# Altium footprint library ESKDPcbLib.PcbLib: 608 footprints (part 20 of 38)
Each footprint in its own frame and in the unit in brackets; x right, y up, seen from the top. Pads: shape width x height; smd on the part's side, far side on the other; paste and mask are expansions set on the pad; w line width, h text height; cw(c..) or ccw(c..) is an arc to the next point about the centre after c.
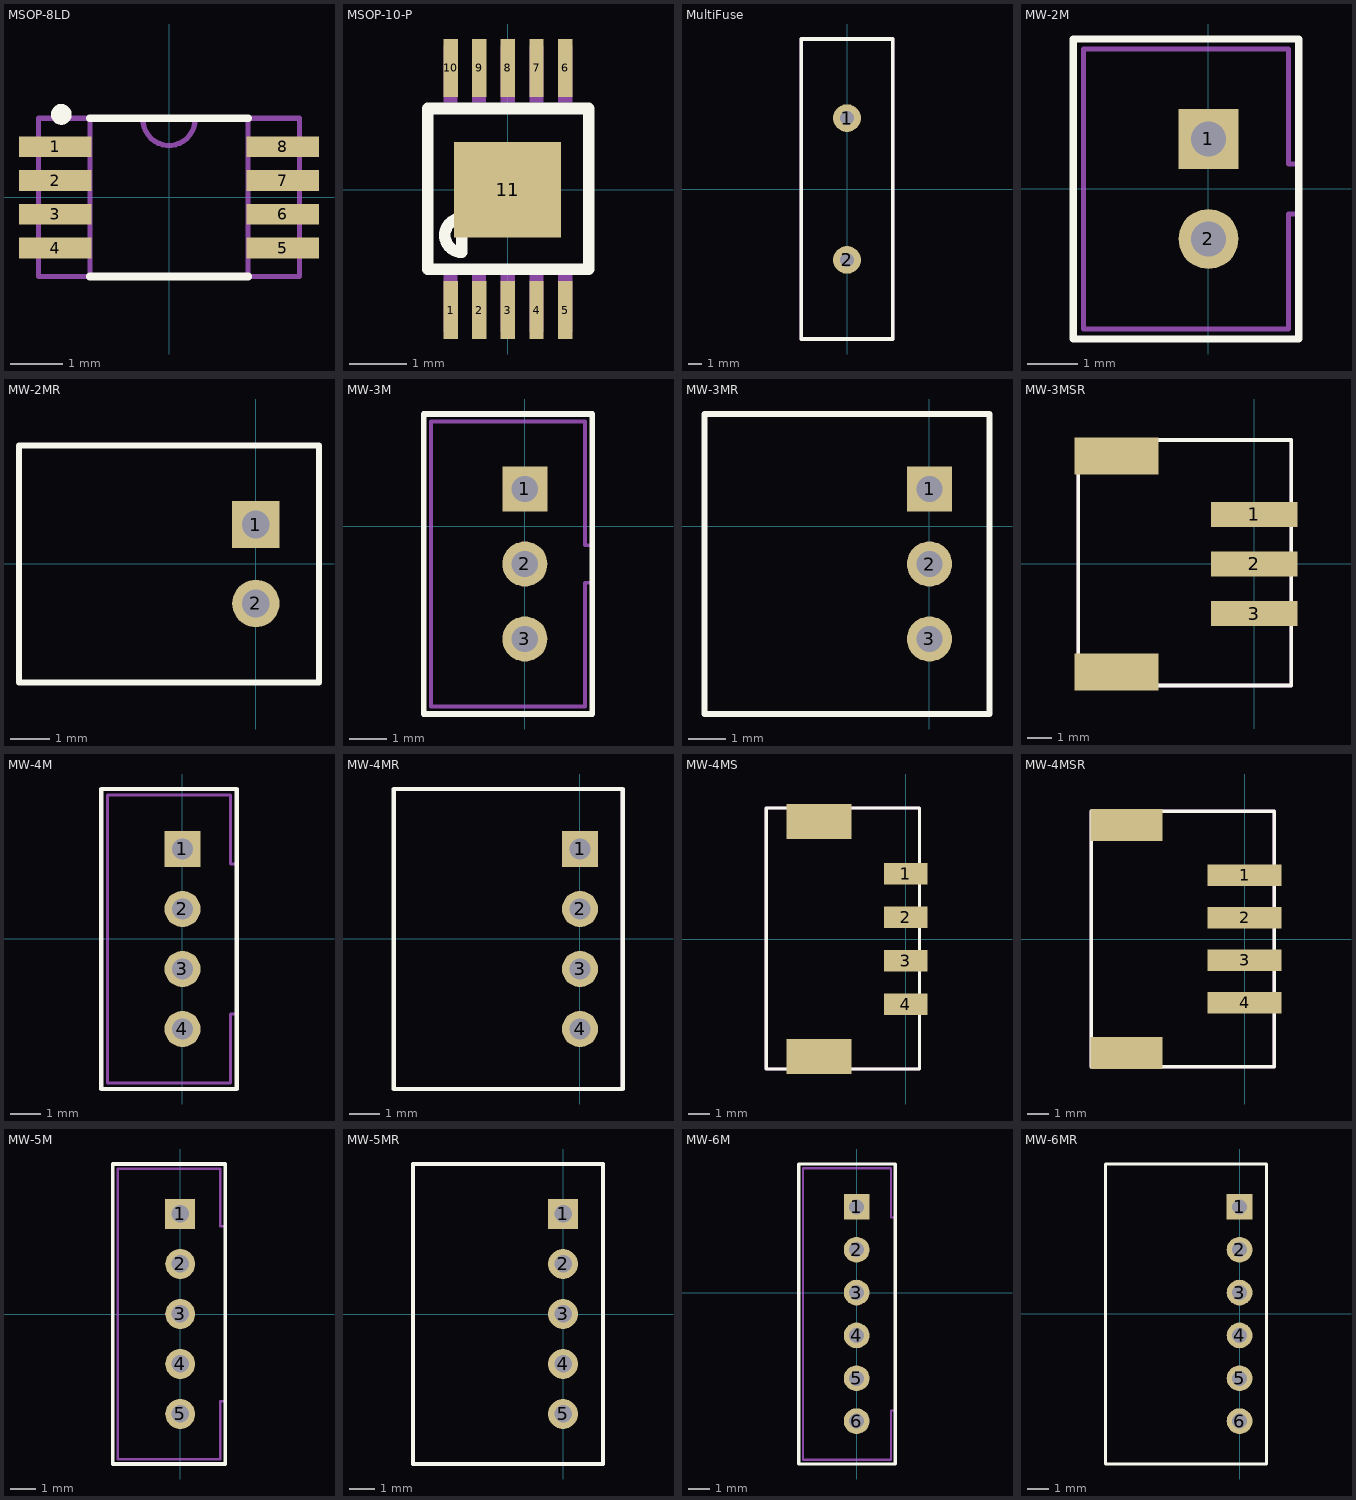
[diagram p19: the footprints below, top view; thin cyan lines are the x and y axes]

## MSOP-8LD [mm]
height 0.9
pads (8):
  rect 1.4x0.4 smd: 1(-2.19,0.975) 2(-2.19,0.325) 3(-2.19,-0.325) 4(-2.19,-0.975) 5(2.19,-0.975) 6(2.19,-0.325) 7(2.19,0.325) 8(2.19,0.975)
Top Overlay:
  circle w0.2: c-2.075,1.6 r0.1
  lines w0.15: -1.525,-1.525 1.525,-1.525 ; -1.525,1.525 1.525,1.525
Mechanical 7:
  lines w0.1: -1.525,-1.525 -1.525,1.525 ; -0.499,1.525 ccw(c0,1.5) 0.499,1.525 ; 1.525,-1.525 1.525,1.525 ; -2.515,-1.525 2.515,-1.525 2.515,1.525 -2.515,1.525 -2.515,-1.525
Mechanical 10:
  text ".Designator" at -0.67,2.04 h0.8
  text ".Comment" at -0.67,-2.26 h0.6
3D body: height 0.92, standoff 0, extent -2.5,-1.5 2.5,1.5

## MSOP-10-P [mil]
pads (11):
  rect 10x40 smd: 1(-39.37,-83.19) 2(-19.68,-83.19) 3(0,-83.19) 4(20,-83.19) 5(40,-83.19) 6(40,84) 7(20,84) 8(0,84) 9(-19.68,84) 10(-39.37,84)
  rect 74x66 smd: 11(0,0)
Top Overlay:
  lines w8: -55.12,-55.12 -55.12,56 56,56 56,-55.12 -55.12,-55.12 ; -31.5,-43.31 cw(c-31.5,-31.5) -31.5,-19.68 -31.5,-43.31
Mechanical 16:
  region: -34.47,99 -44.31,99 -44.31,60 -34.47,60
  region: -14.79,99 -24.63,99 -24.63,60 -14.79,60
  region: 5,99 -4.94,99 -4.94,60 5,60
  region: 25,99 15,99 15,60 25,60
  region: 45,99 35,99 35,60 45,60
  rectangle: 35,-98.43 45,-59.06
  rectangle: 15,-98.43 25,-59.06
  rectangle: -4.9,-98.43 5,-59.06
  rectangle: -24.58,-98.43 -14.74,-59.06
  rectangle: -44.27,-98.43 -34.43,-59.06

## MultiFuse [mm] "MF-R250...R900"
pads (2):
  round 2 hole 1: 1(0,5.1) 2(0,-5.1)
Top Overlay:
  lines w0.254: -3.3,-10.8 3.3,-10.8 3.3,10.8 -3.3,10.8 -3.3,-10.8
Mechanical 7:
  lines w0.254: -3.3,-10.8 3.3,-10.8 3.3,10.8 -3.3,10.8 -3.3,-10.8
Mechanical 10:
  text ".Designator" at 4.1,7.6 h1.52
  text ".Comment" at 4.2,8.9 h1.52
3D body "MF-R700.STEP": height 29.8, standoff -4, extent -3.277,-10.801 3.277,10.801

## MW-2M [mm]
height 6
pads (2):
  rect 1.2x1.2 hole 0.7: 1(0,1)
  round 1.2 hole 0.7: 2(0,-1)
Top Overlay:
  lines w0.15: -2.7,-3 -2.7,3 1.8,3 1.8,-3 -2.7,-3
Mechanical 7:
  lines w0.1: 1.79,0.5 1.6,0.5 1.6,2.8 -2.5,2.8 -2.5,-2.8 1.6,-2.8 1.6,-0.5 1.8,-0.5 ; -2.7,-3 1.8,-3 1.8,3 -2.7,3 -2.7,-3
Mechanical 10:
  text ".Comment" at -1.27,3.41 h0.6
  text ".Designator" at -1.28,3.98 h0.8
3D body: height 6, standoff -3.2, extent -2.7,-3 1.8,3

## MW-2MR [mm]
height 4.5
pads (2):
  rect 1.2x1.2 hole 0.7: 1(0,1)
  round 1.2 hole 0.7: 2(0,-1)
Top Overlay:
  lines w0.15: -6,-3 -6,3 1.6,3 1.6,-3 -6,-3
Mechanical 7:
  lines w0.1: -6,-3 1.6,-3 1.6,3 -6,3 -6,-3
Mechanical 10:
  text ".Designator" at -3.43,4 h0.8
  text ".Comment" at -3.42,3.43 h0.6
3D body: height 4.5, standoff 0, extent -6,-3 1.6,3

## MW-3M [mm]
pads (3):
  rect 1.2x1.2 hole 0.7: 1(0,1)
  round 1.2 hole 0.7: 2(0,-1) 3(0,-3)
Top Overlay:
  lines w0.15: -2.7,-5 1.8,-5 1.8,3 -2.7,3 -2.7,-5
Mechanical 7:
  lines w0.1: 1.79,-0.5 1.6,-0.5 1.6,2.8 -2.5,2.8 -2.5,-4.8 1.6,-4.8 1.6,-1.5 1.8,-1.5 ; -2.7,-5 -2.7,3 1.8,3 1.8,-5 -2.7,-5
Mechanical 10:
  text ".Designator" at -1.28,3.98 h0.8
  text ".Comment" at -1.27,3.41 h0.6
3D body: height 6, standoff -3.4, extent -2.7,-4.95 1.8,2.95

## MW-3MR [mm]
pads (3):
  rect 1.2x1.2 hole 0.7: 1(0,1)
  round 1.2 hole 0.7: 2(0,-1) 3(0,-3)
Top Overlay:
  lines w0.15: -6,-5 1.6,-5 1.6,3 -6,3 -6,-5
Mechanical 7:
  lines w0.1: -6,-5 -6,3 1.6,3 1.6,-5 -6,-5
Mechanical 10:
  text ".Comment" at -3.42,3.43 h0.6
  text ".Designator" at -3.43,4 h0.8
3D body: height 4.8, standoff -3.4, extent -6,-4.95 1.6,2.95

## MW-3MSR [mm]
pads (5):
  rect 3.5x1 smd: 1(0,2) 2(0,0) 3(0,-2)
  rect 3.4x1.5 smd: ""(-5.55,-4.35) ""(-5.55,4.35)
Top Overlay:
  lines w0.15: -7.1,-4.9 -7.1,5 1.5,5 1.5,-4.9 -7.1,-4.9
Mechanical 7:
  lines w0.15: -7.1,-4.9 -7.1,5 1.5,5 1.5,-4.9 -7.1,-4.9
Mechanical 10:
  text ".Designator" at -3.43,8.03 h0.8
  text ".Comment" at -3.42,7.46 h0.6
3D body: height 5.5, standoff -0.1, extent -7.1,-4.9 1.5,5

## MW-4M [mm]
height 6
pads (4):
  rect 1.2x1.2 hole 0.7: 1(0,3)
  round 1.2 hole 0.7: 2(0,1) 3(0,-1) 4(0,-3)
Top Overlay:
  lines w0.15: -2.7,-5 1.8,-5 1.8,5 -2.7,5 -2.7,-5
Mechanical 7:
  lines w0.1: 1.79,-2.5 1.6,-2.5 1.6,-4.8 -2.5,-4.8 -2.5,4.8 1.6,4.8 1.6,2.5 1.79,2.5 ; -2.7,-5 1.8,-5 1.8,5 -2.7,5 -2.7,-5
Mechanical 10:
  text ".Comment" at -1.27,5.41 h0.6
  text ".Designator" at -1.28,5.98 h0.8
3D body "B4B-PH-K-S.STEP": height 6, standoff -3.4, extent -2.7,-4.95 1.8,4.95

## MW-4MR [mm]
height 4.5
pads (4):
  rect 1.2x1.2 hole 0.7: 1(0,3)
  round 1.2 hole 0.7: 2(0,1) 3(0,-1) 4(0,-3)
Top Overlay:
  lines w0.15: -6.2,-5 1.425,-5 1.425,5 -6.2,5 -6.2,-5
Mechanical 7:
  lines w0.1: -6.225,-5 -6.225,5 1.4,5 1.4,-5 -6.225,-5
Mechanical 10:
  text ".Comment" at -3.42,5.46 h0.6
  text ".Designator" at -3.43,6.03 h0.8
3D body: height 4.9, standoff -3.3, extent -6.275,-4.95 1.325,4.95

## MW-4MS [mm]
pads (6):
  rect 2x1 smd: 1(0,3) 2(0,1) 3(0,-1) 4(0,-3)
  rect 3x1.6 smd: ""(-4,-5.4) ""(-4,5.4)
Top Overlay:
  lines w0.15: -6.425,-5.975 0.625,-5.975 0.625,6.025 -6.425,6.025 -6.425,-5.975
Mechanical 7:
  lines w0.15: -6.425,-5.975 0.625,-5.975 0.625,6.025 -6.425,6.025 -6.425,-5.975
Mechanical 10:
  text ".Comment" at -3.42,7.46 h0.6
  text ".Designator" at -3.43,8.03 h0.8
3D body: height 6.6, standoff 0, extent -6.45,-5.9 0.55,6.05

## MW-4MSR [mm]
pads (6):
  rect 3.5x1 smd: 1(0,3) 2(0,1) 3(0,-1) 4(0,-3)
  rect 3.4x1.5 smd: ""(-5.55,-5.35) ""(-5.55,5.35)
Top Overlay:
  lines w0.15: -7.2,-6 -7.2,6 1.4,6 1.4,-6 -7.2,-6
Mechanical 7:
  lines w0.15: -7.2,-6 -7.2,6 1.4,6 1.4,-6 -7.2,-6
Mechanical 10:
  text ".Designator" at -3.43,8.03 h0.8
  text ".Comment" at -3.42,7.46 h0.6
3D body: height 5.5, standoff -0.1, extent -7.2,-5.925 1.4,5.975

## MW-5M [mm]
height 6
pads (5):
  rect 1.2x1.2 hole 0.7: 1(0,4)
  round 1.2 hole 0.7: 2(0,2) 3(0,0) 4(0,-2) 5(0,-4)
Top Overlay:
  lines w0.15: -2.7,-6 -2.7,6 1.8,6 1.8,-6 -2.7,-6
Mechanical 7:
  lines w0.1: 1.79,-3.5 1.6,-3.5 1.6,-5.8 -2.5,-5.8 -2.5,5.8 1.6,5.8 1.6,3.5 1.79,3.5 ; -2.7,-6 -2.7,6 1.8,6 1.8,-6 -2.7,-6
Mechanical 10:
  text ".Designator" at -1.28,6.98 h0.8
  text ".Comment" at -1.27,6.41 h0.6
3D body: height 6, standoff 0, extent -2.7,-6 1.8,6

## MW-5MR [mm]
height 4.5
pads (5):
  rect 1.2x1.2 hole 0.7: 1(0,4)
  round 1.2 hole 0.7: 2(0,2) 3(0,0) 4(0,-2) 5(0,-4)
Top Overlay:
  lines w0.15: -6,-6 1.6,-6 1.6,6 -6,6 -6,-6
Mechanical 7:
  lines w0.1: -6,-6 1.6,-6 1.6,6 -6,6 -6,-6
Mechanical 10:
  text ".Designator" at -3.43,7.03 h0.8
  text ".Comment" at -3.42,6.46 h0.6
3D body: height 4.5, standoff 0, extent -6,-6 1.6,6

## MW-6M [mm]
height 6
pads (6):
  rect 1.2x1.2 hole 0.7: 1(0,4)
  round 1.2 hole 0.7: 2(0,2) 3(0,0) 4(0,-2) 5(0,-4) 6(0,-6)
Top Overlay:
  lines w0.15: -2.7,-8 -2.7,6 1.8,6 1.8,-8 -2.7,-8
Mechanical 7:
  lines w0.1: 1.79,-5.5 1.6,-5.5 1.6,-7.8 -2.5,-7.8 -2.5,5.8 1.6,5.8 1.6,3.5 1.79,3.5 ; -2.7,-8 -2.7,6 1.8,6 1.8,-8 -2.7,-8
Mechanical 10:
  text ".Designator" at -1.28,6.98 h0.8
  text ".Comment" at -1.27,6.41 h0.6
3D body: height 6, standoff 0, extent -2.7,-8 1.8,6

## MW-6MR [mm]
pads (6):
  rect 1.2x1.2 hole 0.7: 1(0,5)
  round 1.2 hole 0.7: 2(0,3) 3(0,1) 4(0,-1) 5(0,-3) 6(0,-5)
Top Overlay:
  lines w0.15: -6.25,-7 1.25,-7 1.25,7 -6.25,7 -6.25,-7
Mechanical 7:
  lines w0.1: -6.25,-7 1.25,-7 1.25,7 -6.25,7 -6.25,-7
Mechanical 10:
  text ".Designator" at -3.43,8.03 h0.8
  text ".Comment" at -3.42,7.46 h0.6
3D body: height 4.8, standoff -3.4, extent -6.3,-6.95 1.3,6.95